# Altium footprint library EMDC_Packages.PcbLib: 274 footprints (part 12 of 18)
Each footprint in its own frame and in the unit in brackets; x right, y up, seen from the top. Pads: shape width x height; smd on the part's side, far side on the other; paste and mask are expansions set on the pad; w line width, h text height; cw(c..) or ccw(c..) is an arc to the next point about the centre after c.
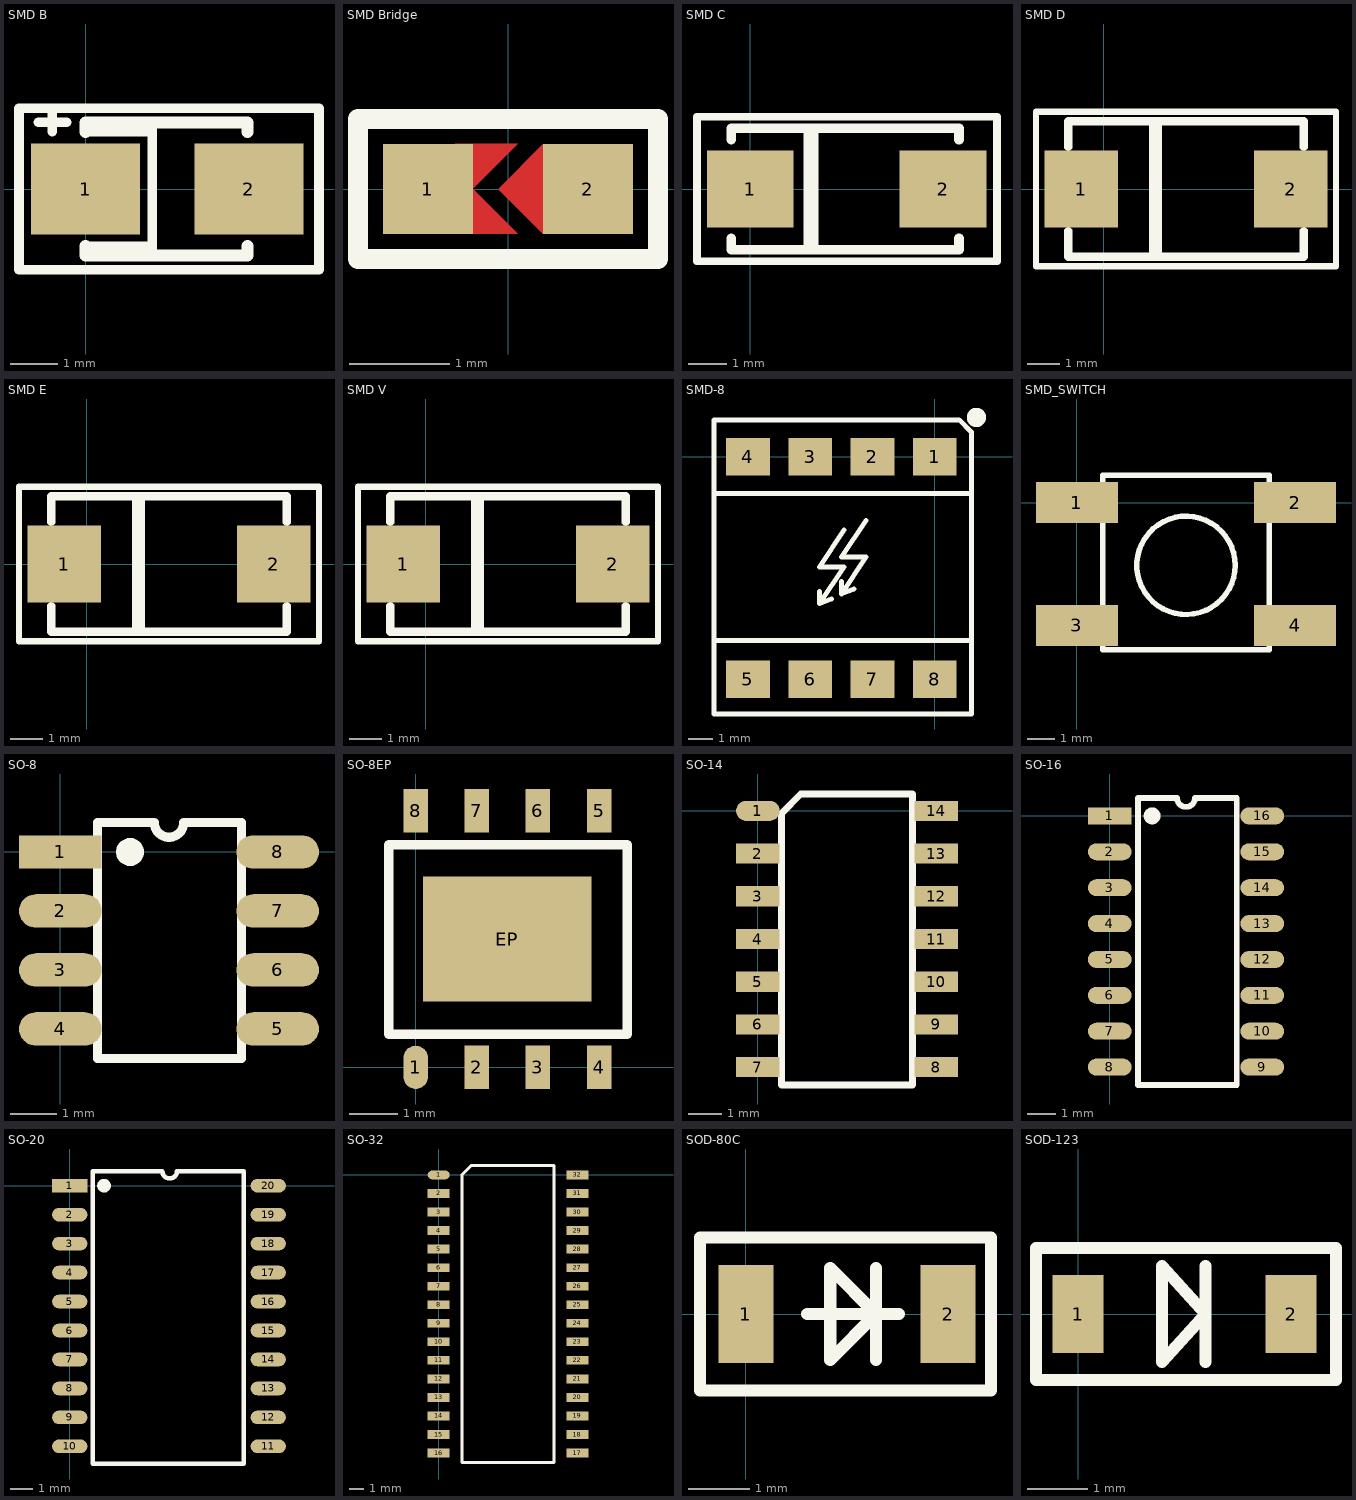
[diagram p11: the footprints below, top view; thin cyan lines are the x and y axes]

## SMD B [mil] "SMD B Tantalum electrolytic capacitor"
pads (2):
  rect 90x75 smd: 1(0,0) 2(135,0)
Top Overlay:
  lines w7.87: -39.37,55.12 -15.75,55.12 ; -27.56,47.24 -27.56,66.93 ; 0,-47.24 55.12,-47.24 ; 0,47.24 51.18,47.24 ; 55.12,-55.12 55.12,51.18 ; -55.12,-66.93 -55.12,66.93 192.91,66.93 192.91,-66.93 -55.12,-66.93 ; 47.24,-55.12 47.24,-55.12
  lines w10: 133.86,-47.24 133.86,-55.12 0,-55.12 0,-47.24 ; 133.86,47.24 133.86,55.12 0,55.12 0,47.24 ; 0,-47.24 0,-47.24 ; 0,47.24 0,47.24
3D body "User Library-SMD B.STEP": height 76.82, standoff 1.57, extent -3.21,-56.1 141,54.13

## SMD Bridge [mm]
pads (2):
  rect 0.9x0.9 smd: 1(-0.8,0) 2(0.8,0)
Top Layer:
  region: 0.35,0.45 -0.1,0 0.35,-0.45 0.5,-0.45 0.5,0.45
  region: -0.525,0.45 0.1,0.45 -0.35,0 0.1,-0.45 -0.525,-0.45
Top Overlay:
  lines w0.2: -1.5,-0.7 1.5,-0.7 1.5,0.7 -1.5,0.7 -1.5,-0.7
Top Solder:
  rectangle: -0.125,-0.55 0.525,0.55

## SMD C [mil] "SMD C Tantalum electrolytic capacitor"
pads (2):
  rect 90x80 smd: 1(0,0) 2(200,0)
Top Overlay:
  lines w7.87: 59.06,-59.06 59.06,62.99 ; 66.93,-62.99 66.93,62.99 ; -55.12,-74.8 255.91,-74.8 255.91,74.8 -55.12,74.8 -55.12,-74.8
  lines w10: -19.68,-51.18 -19.68,-62.99 216.54,-62.99 216.54,-51.18 ; -19.68,51.18 -19.68,62.99 216.54,62.99 216.54,51.18
3D body "User Library-C_case.STEP": height 106.3, standoff 0, extent -21.65,-66.93 218.51,64.96

## SMD D [mm] "SMD D Tantalum electrolytic capacitor"
pads (2):
  rect 2.286x2.4 smd: 1(-0.7,0) 2(5.8,0)
Top Overlay:
  lines w0.2: 1.5,-2.1 1.5,2.1 ; 1.7,-2.1 1.7,2.1 ; -2.1,-2.4 -2.1,2.4 7.2,2.4 7.2,-2.4 -2.1,-2.4
  lines w0.254: -1.1,-1.3 -1.1,-2.1 6.2,-2.1 6.2,-1.3 ; -1.1,1.3 -1.1,2.1 6.2,2.1 6.2,1.3
3D body "User Library-CAP_TANT_7343-31.step": height 3.1, standoff 0, extent -1.25,-2.3 6.35,2.3

## SMD E [mm] "SMD E Tantalum electrolytic capacitor"
pads (2):
  rect 2.286x2.4 smd: 1(-0.7,0) 2(5.8,0)
Top Overlay:
  lines w0.2: 1.5,-2.1 1.5,2.1 ; 1.7,-2.1 1.7,2.1 ; -2.1,-2.4 -2.1,2.4 7.2,2.4 7.2,-2.4 -2.1,-2.4
  lines w0.254: -1.1,-1.3 -1.1,-2.1 6.2,-2.1 6.2,-1.3 ; -1.1,1.3 -1.1,2.1 6.2,2.1 6.2,1.3
3D body "User Library-AVX_E_CASE.step": height 4.2, standoff 0, extent -1.15,-2.25 6.25,2.2

## SMD V [mm] "SMD V Tantalum electrolytic capacitor"
pads (2):
  rect 2.286x2.4 smd: 1(-0.7,0) 2(5.8,0)
Top Overlay:
  lines w0.2: 1.5,-2.1 1.5,2.1 ; 1.7,-2.1 1.7,2.1 ; -2.1,-2.4 -2.1,2.4 7.2,2.4 7.2,-2.4 -2.1,-2.4
  lines w0.254: -1.1,-1.3 -1.1,-2.1 6.2,-2.1 6.2,-1.3 ; -1.1,1.3 -1.1,2.1 6.2,2.1 6.2,1.3
3D body "User Library-CaseV_7343-20.step": height 2, standoff 0, extent -1.15,-2.175 6.15,2.125

## SMD-8 [mm] "Package for SMD optocouplers"
pads (8):
  rect 1.78x1.52 smd: 1(0,0) 2(-2.54,0) 3(-5.08,0) 4(-7.62,0) 5(-7.62,-9.085) 6(-5.08,-9.085) 7(-2.54,-9.085) 8(0,-9.085)
Top Overlay:
  circle w0.5: c1.7,1.6 r0.141
  lines w0.2: -9,-7.5 1.5,-7.5 ; -9,-1.5 1.5,-1.5 ; -4.7,-5.5 -4.7,-6 ; -4.2,-5.8 -4.7,-6 ; -3.8,-5.1 -3.8,-5.6 ; -3.7,-3 -4.7,-4.5 -3.7,-4.5 -4.7,-6 ; -3.3,-5.4 -3.8,-5.6 ; -2.8,-2.6 -3.8,-4.1 -2.8,-4.1 -3.8,-5.6 ; -9,-10.5 1.5,-10.5 1.5,1 1,1.5 -9,1.5 -9,-10.5
3D body "User Library-SMD-8B.step": height 4, standoff 0, extent -8.725,-9.4 1.125,0.4

## SMD_SWITCH [mm]
pads (4):
  rect 3x1.5 smd: 1(0,0) 2(8,0) 3(0,-4.5) 4(8,-4.5)
Top Overlay:
  circle w0.2: c4,-2.3 r1.803
  lines w0.2: 0.95,-5.4 7.05,-5.4 7.05,1 0.95,1 0.95,-5.4
3D body "User Library-FSM4JSMATR - TE Connectivity - SPST 6mm Tactile Switch.STEP": height 4.97, standoff 0, extent -1,-5.2 9,0.8

## SO-8 [mm]
pads (8):
  rect 1.78x0.72 smd: 1(0,0)
  oval 1.78x0.72 smd: 2(0,-1.27) 3(0,-2.54) 4(0,-3.81) 5(4.68,-3.81) 6(4.68,-2.54) 7(4.68,-1.27) 8(4.68,0)
Top Overlay:
  circle w0.3: c1.5,0 r0.15
  lines w0.2: 0.8,-4.445 3.9,-4.445 3.9,0.635 2.658,0.635 cw(c2.34,0.635) 2.023,0.635 0.8,0.635 0.8,-4.445
3D body "SO-8.step": height 1.7, standoff 0, extent -0.65,-4.35 5.35,0.55

## SO-8EP [mm]
pads (9):
  oval 0.51x0.9 smd: 1(0,0)
  rect 0.51x0.9 smd: 2(1.27,0) 3(2.54,0) 4(3.81,0) 5(3.81,5.334) 6(2.54,5.334) 7(1.27,5.334) 8(0,5.334)
  rect 3.5x2.6 smd: EP(1.905,2.667)
Top Overlay:
  lines w0.2: -0.558,0.687 4.395,0.687 4.395,4.624 -0.558,4.624 -0.558,0.687
3D body "SO-8.step": height 1.7, standoff 0, extent -0.525,-0.325 4.375,5.675

## SO-14 [mm]
pads (14):
  oval 1.3x0.6 smd: 1(0,0)
  rect 1.3x0.6 smd: 2(0,-1.27) 3(0,-2.54) 4(0,-3.81) 5(0,-5.08) 6(0,-6.35) 7(0,-7.62) 8(5.3,-7.62) 9(5.3,-6.35) 10(5.3,-5.08) 11(5.3,-3.81) 12(5.3,-2.54) 13(5.3,-1.27) 14(5.3,0)
Top Overlay:
  lines w0.2: 0.7,-8.15 4.6,-8.15 4.6,0.5 1.275,0.5 0.7,-0.075 0.7,-8.15
3D body "User Library-so14-1.STEP": height 1.7, standoff 0, extent -0.375,-8.225 5.625,0.575

## SO-16 [mm]
pads (16):
  rect 1.55x0.6 smd: 1(0,0)
  oval 1.55x0.6 smd: 2(0,-1.27) 3(0,-2.54) 4(0,-3.81) 5(0,-5.08) 6(0,-6.35) 7(0,-7.62) 8(0,-8.89) 9(5.4,-8.89) 10(5.4,-7.62) 11(5.4,-6.35) 12(5.4,-5.08) 13(5.4,-3.81) 14(5.4,-2.54) 15(5.4,-1.27) 16(5.4,0)
Top Overlay:
  circle w0.3: c1.5,0 r0.15
  lines w0.2: 1,-9.525 4.5,-9.525 4.5,0.635 3.017,0.635 cw(c2.7,0.635) 2.382,0.635 1,0.635 1,-9.525
3D body "User Library-so16.STEP": height 1.7, standoff 0, extent -0.325,-9.55 5.675,0.65

## SO-20 [mm]
pads (20):
  rect 1.55x0.6 smd: 1(0,0)
  oval 1.55x0.6 smd: 2(0,-1.27) 3(0,-2.54) 4(0,-3.81) 5(0,-5.08) 6(0,-6.35) 7(0,-7.62) 8(0,-8.89) 9(0,-10.16) 10(0,-11.43) 11(8.702,-11.43) 12(8.702,-10.16) 13(8.702,-8.89) 14(8.702,-7.62) 15(8.702,-6.35) 16(8.702,-5.08) 17(8.702,-3.81) 18(8.702,-2.54) 19(8.702,-1.27) 20(8.702,0)
Top Overlay:
  circle w0.3: c1.5,0 r0.15
  lines w0.2: 1,-12.192 7.62,-12.192 7.62,0.635 4.699,0.635 cw(c4.381,0.635) 4.064,0.635 1,0.635 1,-12.192

## SO-32 [mm]
pads (32):
  oval 1.5x0.6 smd: 1(0,0)
  rect 1.5x0.6 smd: 2(0,-1.27) 3(0,-2.54) 4(0,-3.81) 5(0,-5.08) 6(0,-6.35) 7(0,-7.62) 8(0,-8.89) 9(0,-10.16) 10(0,-11.43) 11(0,-12.7) 12(0,-13.97) 13(0,-15.24) 14(0,-16.51) 15(0,-17.78) 16(0,-19.05) 17(9.5,-19.05) 18(9.5,-17.78) 19(9.5,-16.51) 20(9.5,-15.24) 21(9.5,-13.97) 22(9.5,-12.7) 23(9.5,-11.43) 24(9.5,-10.16) 25(9.5,-8.89) 26(9.5,-7.62) 27(9.5,-6.35) 28(9.5,-5.08) 29(9.5,-3.81) 30(9.5,-2.54) 31(9.5,-1.27) 32(9.5,0)
Top Overlay:
  lines w0.2: 1.585,-19.685 1.585,0 2.22,0.635 7.915,0.635 7.915,-19.685 1.585,-19.685

## SOD-80C [mm] "SMD Diode"
height 1.6
pads (2):
  rect 0.9x1.6 smd: 1(0,0) 2(3.3,0)
Top Overlay:
  lines w0.2: 1,0 2.5,0 ; 2.125,-0.75 2.125,0.75 ; -0.75,-1.25 4,-1.25 4,1.25 -0.75,1.25 -0.75,-1.25 ; 1.375,-0.75 1.375,0.75 2.125,0 1.375,-0.75
3D body "User Library-SOD80-3.STEP": height 1.55, standoff 0.05, extent -0.125,-0.75 3.475,0.75

## SOD-123 [mm] "SOD-123 diode package"
pads (2):
  rect 0.85x1.3 smd: 1(0,0) 2(3.55,0)
Top Overlay:
  lines w0.2: 2.125,-0.8 2.125,0.8 ; -0.7,-1.1 4.3,-1.1 4.3,1.1 -0.7,1.1 -0.7,-1.1 ; 1.4,-0.8 2.125,0 1.4,0.8 1.4,-0.8
3D body "User Library-SOD123-1.STEP": height 1.18, standoff 0, extent -0.175,-0.9 3.725,0.9